# Altium footprint library General_Lib.PcbLib: 729 footprints (part 22 of 46)
Each footprint in its own frame and in the unit in brackets; x right, y up, seen from the top. Pads: shape width x height; smd on the part's side, far side on the other; paste and mask are expansions set on the pad; w line width, h text height; cw(c..) or ccw(c..) is an arc to the next point about the centre after c.
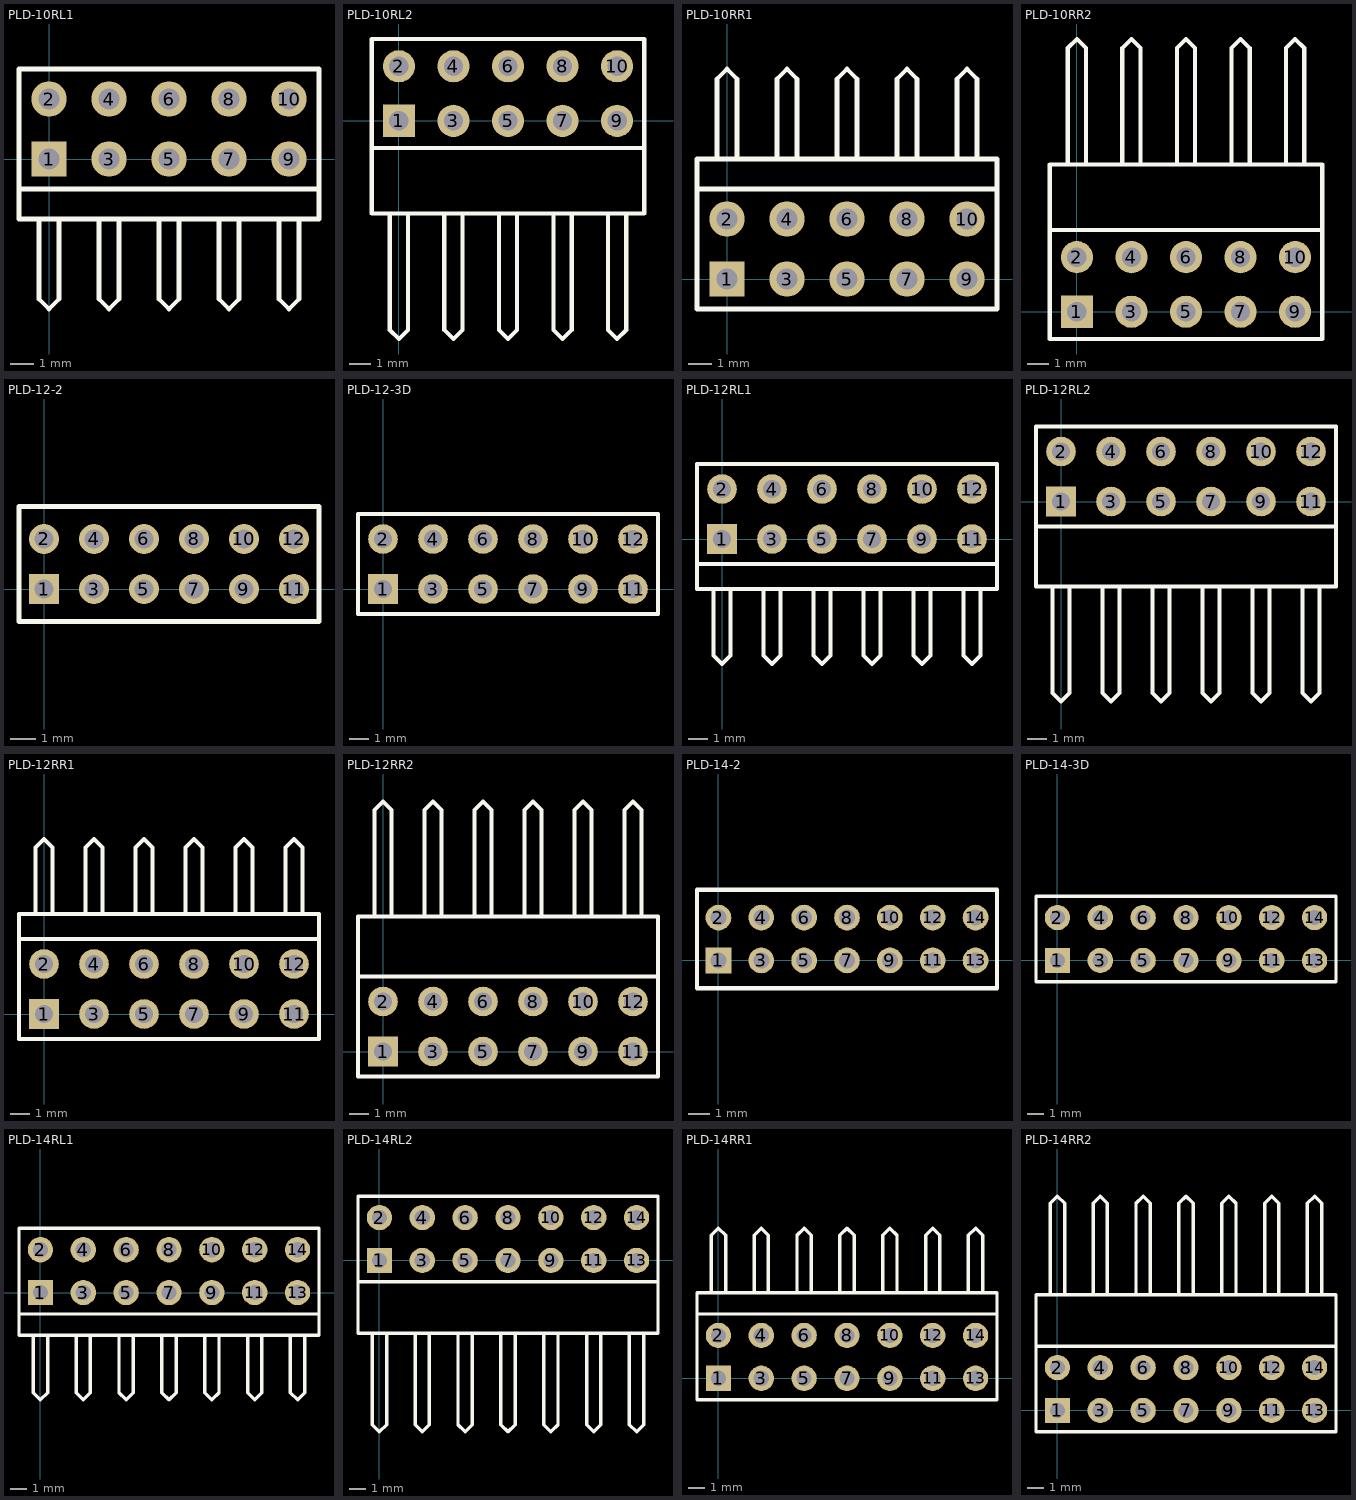
[diagram p21: the footprints below, top view; thin cyan lines are the x and y axes]

## PLD-10RL1 [mm] "Connector; Header; 5x2 Position"
height 7
pads (10):
  rect 1.5x1.5 hole 0.9: 1(0,0)
  round 1.5 hole 0.9: 2(0,2.54) 3(2.54,0) 4(2.54,2.54) 5(5.08,0) 6(5.08,2.54) 7(7.62,0) 8(7.62,2.54) 9(10.16,0) 10(10.16,2.54)
Top Overlay:
  lines w0.2: -0.423,-2.54 -0.423,-5.927 0,-6.35 0.423,-5.927 0.423,-2.54 ; 2.117,-2.54 2.117,-5.927 2.54,-6.35 2.963,-5.927 2.963,-2.54 ; 4.657,-2.54 4.657,-5.927 5.08,-6.35 5.503,-5.927 5.503,-2.54 ; 7.197,-2.54 7.197,-5.927 7.62,-6.35 8.043,-5.927 8.043,-2.54 ; 9.737,-2.54 9.737,-5.927 10.16,-6.35 10.583,-5.927 10.583,-2.54 ; -1.27,-1.27 -1.27,-2.54 11.43,-2.54 11.43,-1.27 ; -1.27,-1.27 11.43,-1.27 ; -1.27,-1.27 -1.27,3.81 11.43,3.81 11.43,-1.27
3D body "PLS-1R.step": height 5.45, standoff -3, extent 3.81,-7.35 6.35,1.27
3D body "PLS-1Rr.stp": height 7.99, standoff -3, extent 3.81,-7.35 6.35,3.81
3D body "PLS-1Rr.stp": height 7.99, standoff -3, extent 1.27,-7.35 3.81,3.81
3D body "PLS-1R.step": height 5.45, standoff -3, extent 1.27,-7.35 3.81,1.27
3D body "PLS-1R.step": height 5.45, standoff -3, extent 8.89,-7.35 11.43,1.27
3D body "PLS-1Rr.stp": height 7.99, standoff -3, extent 8.89,-7.35 11.43,3.81
3D body "PLS-1Rr.stp": height 7.99, standoff -3, extent 6.35,-7.35 8.89,3.81
3D body "PLS-1R.step": height 5.45, standoff -3, extent 6.35,-7.35 8.89,1.27
3D body "PLS-1R.step": height 5.45, standoff -3, extent -1.27,-7.35 1.27,1.27
3D body "PLS-1Rr.stp": height 7.99, standoff -3, extent -1.27,-7.35 1.27,3.81

## PLD-10RL2 [mm] "Connector; Header; 5x2 Position"
height 5
pads (10):
  rect 1.5x1.5 hole 0.9: 1(0,0)
  round 1.5 hole 0.9: 2(0,2.54) 3(2.54,0) 4(2.54,2.54) 5(5.08,0) 6(5.08,2.54) 7(7.62,0) 8(7.62,2.54) 9(10.16,0) 10(10.16,2.54)
Top Overlay:
  lines w0.2: -0.423,-4.318 -0.423,-9.737 0,-10.16 0.423,-9.737 0.423,-4.318 ; 2.117,-4.318 2.117,-9.737 2.54,-10.16 2.963,-9.737 2.963,-4.318 ; 4.657,-4.318 4.657,-9.737 5.08,-10.16 5.503,-9.737 5.503,-4.318 ; 7.197,-4.318 7.197,-9.737 7.62,-10.16 8.043,-9.737 8.043,-4.318 ; 9.737,-4.318 9.737,-9.737 10.16,-10.16 10.583,-9.737 10.583,-4.318 ; 11.43,-1.27 -1.27,-1.27 ; -1.27,-1.27 -1.27,-4.318 11.43,-4.318 11.43,3.81 -1.27,3.81 -1.27,-1.27
3D body "PLD-R2.stp": height 5.08, standoff -2.6, extent -1.27,-9.976 1.27,2.864
3D body "PLD-R2.stp": height 5.08, standoff -2.6, extent 1.27,-9.976 3.81,2.864
3D body "PLD-R2.stp": height 5.08, standoff -2.6, extent 3.81,-9.976 6.35,2.864
3D body "PLD-R2.stp": height 5.08, standoff -2.6, extent 6.35,-9.976 8.89,2.864
3D body "PLD-R2.stp": height 5.08, standoff -2.6, extent 8.89,-9.976 11.43,2.864

## PLD-10RR1 [mm] "Connector; Header; 5x2 Position"
height 7
pads (10):
  rect 1.5x1.5 hole 0.9: 1(0,0)
  round 1.5 hole 0.9: 2(0,2.54) 3(2.54,0) 4(2.54,2.54) 5(5.08,0) 6(5.08,2.54) 7(7.62,0) 8(7.62,2.54) 9(10.16,0) 10(10.16,2.54)
Top Overlay:
  lines w0.2: -0.423,5.08 -0.423,8.467 0,8.89 0.423,8.467 0.423,5.08 ; 2.117,5.08 2.117,8.467 2.54,8.89 2.963,8.467 2.963,5.08 ; 4.657,5.08 4.657,8.467 5.08,8.89 5.503,8.467 5.503,5.08 ; 7.197,5.08 7.197,8.467 7.62,8.89 8.043,8.467 8.043,5.08 ; 9.737,5.08 9.737,8.467 10.16,8.89 10.583,8.467 10.583,5.08 ; -1.27,3.81 -1.27,5.08 11.43,5.08 11.43,3.81 ; -1.27,3.81 11.43,3.81 ; -1.27,3.81 -1.27,-1.27 11.43,-1.27 11.43,3.81
3D body "PLS-1R.step": height 5.45, standoff -3, extent 3.81,1.27 6.35,9.89
3D body "PLS-1Rr.stp": height 7.99, standoff -3, extent 3.81,-1.27 6.35,9.89
3D body "PLS-1Rr.stp": height 7.99, standoff -3, extent 6.35,-1.27 8.89,9.89
3D body "PLS-1R.step": height 5.45, standoff -3, extent 6.35,1.27 8.89,9.89
3D body "PLS-1R.step": height 5.45, standoff -3, extent -1.27,1.27 1.27,9.89
3D body "PLS-1Rr.stp": height 7.99, standoff -3, extent -1.27,-1.27 1.27,9.89
3D body "PLS-1Rr.stp": height 7.99, standoff -3, extent 1.27,-1.27 3.81,9.89
3D body "PLS-1R.step": height 5.45, standoff -3, extent 1.27,1.27 3.81,9.89
3D body "PLS-1R.step": height 5.45, standoff -3, extent 8.89,1.27 11.43,9.89
3D body "PLS-1Rr.stp": height 7.99, standoff -3, extent 8.89,-1.27 11.43,9.89

## PLD-10RR2 [mm] "Connector; Header; 5x2 Position"
height 5
pads (10):
  rect 1.5x1.5 hole 0.9: 1(0,0)
  round 1.5 hole 0.9: 2(0,2.54) 3(2.54,0) 4(2.54,2.54) 5(5.08,0) 6(5.08,2.54) 7(7.62,0) 8(7.62,2.54) 9(10.16,0) 10(10.16,2.54)
Top Overlay:
  lines w0.2: -0.423,6.858 -0.423,12.277 0,12.7 0.423,12.277 0.423,6.858 ; 2.117,6.858 2.117,12.277 2.54,12.7 2.963,12.277 2.963,6.858 ; 4.657,6.858 4.657,12.277 5.08,12.7 5.503,12.277 5.503,6.858 ; 7.197,6.858 7.197,12.277 7.62,12.7 8.043,12.277 8.043,6.858 ; 9.737,6.858 9.737,12.277 10.16,12.7 10.583,12.277 10.583,6.858 ; 11.43,3.81 -1.27,3.81 ; -1.27,3.81 -1.27,-1.27 11.43,-1.27 11.43,6.858 -1.27,6.858 -1.27,3.81
3D body "PLD-R2.stp": height 5.08, standoff -2.6, extent 8.89,-0.324 11.43,12.516
3D body "PLD-R2.stp": height 5.08, standoff -2.6, extent 6.35,-0.324 8.89,12.516
3D body "PLD-R2.stp": height 5.08, standoff -2.6, extent 3.81,-0.324 6.35,12.516
3D body "PLD-R2.stp": height 5.08, standoff -2.6, extent 1.27,-0.324 3.81,12.516
3D body "PLD-R2.stp": height 5.08, standoff -2.6, extent -1.27,-0.324 1.27,12.516

## PLD-12-2 [mm] "Connector; Header; 6x2 Position"
height 6
pads (12):
  rect 1.2x1.2 hole 0.75: 1(0,0)
  round 1.2 hole 0.75: 2(0,2) 3(2,0) 4(2,2) 5(4,0) 6(4,2) 7(6,0) 8(6,2) 9(8,0) 10(8,2) 11(10,0) 12(10,2)
Top Overlay:
  lines w0.2: -1,-1.3 11,-1.3 11,3.3 -1,3.3 -1,-1.3
3D body "pld-2mm.stp": height 5.5, standoff -2.5, extent -1,-1.3 1,3.3
3D body "pld-2mm.stp": height 5.5, standoff -2.5, extent 1,-1.3 3,3.3
3D body "pld-2mm.stp": height 5.5, standoff -2.5, extent 3,-1.3 5,3.3
3D body "pld-2mm.stp": height 5.5, standoff -2.5, extent 5,-1.3 7,3.3
3D body "pld-2mm.stp": height 5.5, standoff -2.5, extent 7,-1.3 9,3.3
3D body "pld-2mm.stp": height 5.5, standoff -2.5, extent 9,-1.3 11,3.3

## PLD-12-3D [mm] "Connector; Header; 6x2 Position"
height 7.5
pads (12):
  rect 1.5x1.5 hole 0.9: 1(0,0)
  round 1.5 hole 0.9: 2(0,2.54) 3(2.54,0) 4(2.54,2.54) 5(5.08,0) 6(5.08,2.54) 7(7.62,0) 8(7.62,2.54) 9(10.16,0) 10(10.16,2.54) 11(12.7,0) 12(12.7,2.54)
Top Overlay:
  lines w0.2: -1.27,-1.27 13.97,-1.27 13.97,3.81 -1.27,3.81 -1.27,-1.27
3D body "PLD-12.step": height 8.4, standoff -3, extent -1.27,-1.23 13.97,3.77

## PLD-12RL1 [mm] "Connector; Header; 6x2 Position"
height 7
pads (12):
  rect 1.5x1.5 hole 0.9: 1(0,0)
  round 1.5 hole 0.9: 2(0,2.54) 3(2.54,0) 4(2.54,2.54) 5(5.08,0) 6(5.08,2.54) 7(7.62,0) 8(7.62,2.54) 9(10.16,0) 10(10.16,2.54) 11(12.7,0) 12(12.7,2.54)
Top Overlay:
  lines w0.2: -0.423,-2.54 -0.423,-5.927 0,-6.35 0.423,-5.927 0.423,-2.54 ; 2.117,-2.54 2.117,-5.927 2.54,-6.35 2.963,-5.927 2.963,-2.54 ; 4.657,-2.54 4.657,-5.927 5.08,-6.35 5.503,-5.927 5.503,-2.54 ; 7.197,-2.54 7.197,-5.927 7.62,-6.35 8.043,-5.927 8.043,-2.54 ; 9.737,-2.54 9.737,-5.927 10.16,-6.35 10.583,-5.927 10.583,-2.54 ; 12.277,-2.54 12.277,-5.927 12.7,-6.35 13.123,-5.927 13.123,-2.54 ; -1.27,-1.27 -1.27,-2.54 13.97,-2.54 13.97,-1.27 ; -1.27,-1.27 13.97,-1.27 ; -1.27,-1.27 -1.27,3.81 13.97,3.81 13.97,-1.27
3D body "PLS-1R.step": height 5.45, standoff -3, extent 8.89,-7.35 11.43,1.27
3D body "PLS-1Rr.stp": height 7.99, standoff -3, extent 8.89,-7.35 11.43,3.81
3D body "PLS-1Rr.stp": height 7.99, standoff -3, extent 11.43,-7.35 13.97,3.81
3D body "PLS-1R.step": height 5.45, standoff -3, extent 11.43,-7.35 13.97,1.27
3D body "PLS-1R.step": height 5.45, standoff -3, extent 3.81,-7.35 6.35,1.27
3D body "PLS-1Rr.stp": height 7.99, standoff -3, extent 3.81,-7.35 6.35,3.81
3D body "PLS-1Rr.stp": height 7.99, standoff -3, extent 6.35,-7.35 8.89,3.81
3D body "PLS-1R.step": height 5.45, standoff -3, extent 6.35,-7.35 8.89,1.27
3D body "PLS-1R.step": height 5.45, standoff -3, extent -1.27,-7.35 1.27,1.27
3D body "PLS-1Rr.stp": height 7.99, standoff -3, extent -1.27,-7.35 1.27,3.81
3D body "PLS-1Rr.stp": height 7.99, standoff -3, extent 1.27,-7.35 3.81,3.81
3D body "PLS-1R.step": height 5.45, standoff -3, extent 1.27,-7.35 3.81,1.27

## PLD-12RL2 [mm] "Connector; Header; 6x2 Position"
height 5
pads (12):
  rect 1.5x1.5 hole 0.9: 1(0,0)
  round 1.5 hole 0.9: 2(0,2.54) 3(2.54,0) 4(2.54,2.54) 5(5.08,0) 6(5.08,2.54) 7(7.62,0) 8(7.62,2.54) 9(10.16,0) 10(10.16,2.54) 11(12.7,0) 12(12.7,2.54)
Top Overlay:
  lines w0.2: -0.423,-4.318 -0.423,-9.737 0,-10.16 0.423,-9.737 0.423,-4.318 ; 2.117,-4.318 2.117,-9.737 2.54,-10.16 2.963,-9.737 2.963,-4.318 ; 4.657,-4.318 4.657,-9.737 5.08,-10.16 5.503,-9.737 5.503,-4.318 ; 7.197,-4.318 7.197,-9.737 7.62,-10.16 8.043,-9.737 8.043,-4.318 ; 9.737,-4.318 9.737,-9.737 10.16,-10.16 10.583,-9.737 10.583,-4.318 ; 12.277,-4.318 12.277,-9.737 12.7,-10.16 13.123,-9.737 13.123,-4.318 ; 13.97,-1.27 -1.27,-1.27 ; -1.27,-1.27 -1.27,3.81 13.97,3.81 13.97,-4.318 -1.27,-4.318 -1.27,-1.27
3D body "PLD-R2.stp": height 5.08, standoff -2.6, extent 3.81,-9.976 6.35,2.864
3D body "PLD-R2.stp": height 5.08, standoff -2.6, extent 1.27,-9.976 3.81,2.864
3D body "PLD-R2.stp": height 5.08, standoff -2.6, extent -1.27,-9.976 1.27,2.864
3D body "PLD-R2.stp": height 5.08, standoff -2.6, extent 11.43,-9.976 13.97,2.864
3D body "PLD-R2.stp": height 5.08, standoff -2.6, extent 8.89,-9.976 11.43,2.864
3D body "PLD-R2.stp": height 5.08, standoff -2.6, extent 6.35,-9.976 8.89,2.864

## PLD-12RR1 [mm] "Connector; Header; 6x2 Position"
height 7
pads (12):
  rect 1.5x1.5 hole 0.9: 1(0,0)
  round 1.5 hole 0.9: 2(0,2.54) 3(2.54,0) 4(2.54,2.54) 5(5.08,0) 6(5.08,2.54) 7(7.62,0) 8(7.62,2.54) 9(10.16,0) 10(10.16,2.54) 11(12.7,0) 12(12.7,2.54)
Top Overlay:
  lines w0.2: -0.423,5.08 -0.423,8.467 0,8.89 0.423,8.467 0.423,5.08 ; 2.117,5.08 2.117,8.467 2.54,8.89 2.963,8.467 2.963,5.08 ; 4.657,5.08 4.657,8.467 5.08,8.89 5.503,8.467 5.503,5.08 ; 7.197,5.08 7.197,8.467 7.62,8.89 8.043,8.467 8.043,5.08 ; 9.737,5.08 9.737,8.467 10.16,8.89 10.583,8.467 10.583,5.08 ; 12.277,5.08 12.277,8.467 12.7,8.89 13.123,8.467 13.123,5.08 ; -1.27,3.81 -1.27,5.08 13.97,5.08 13.97,3.81 ; -1.27,3.81 13.97,3.81 ; -1.27,3.81 -1.27,-1.27 13.97,-1.27 13.97,3.81
3D body "PLS-1R.step": height 5.45, standoff -3, extent 8.89,1.27 11.43,9.89
3D body "PLS-1Rr.stp": height 7.99, standoff -3, extent 8.89,-1.27 11.43,9.89
3D body "PLS-1Rr.stp": height 7.99, standoff -3, extent 11.43,-1.27 13.97,9.89
3D body "PLS-1R.step": height 5.45, standoff -3, extent 11.43,1.27 13.97,9.89
3D body "PLS-1R.step": height 5.45, standoff -3, extent 3.81,1.27 6.35,9.89
3D body "PLS-1Rr.stp": height 7.99, standoff -3, extent 3.81,-1.27 6.35,9.89
3D body "PLS-1Rr.stp": height 7.99, standoff -3, extent 6.35,-1.27 8.89,9.89
3D body "PLS-1R.step": height 5.45, standoff -3, extent 6.35,1.27 8.89,9.89
3D body "PLS-1R.step": height 5.45, standoff -3, extent -1.27,1.27 1.27,9.89
3D body "PLS-1Rr.stp": height 7.99, standoff -3, extent -1.27,-1.27 1.27,9.89
3D body "PLS-1Rr.stp": height 7.99, standoff -3, extent 1.27,-1.27 3.81,9.89
3D body "PLS-1R.step": height 5.45, standoff -3, extent 1.27,1.27 3.81,9.89

## PLD-12RR2 [mm] "Connector; Header; 6x2 Position"
height 5
pads (12):
  rect 1.5x1.5 hole 0.9: 1(0,0)
  round 1.5 hole 0.9: 2(0,2.54) 3(2.54,0) 4(2.54,2.54) 5(5.08,0) 6(5.08,2.54) 7(7.62,0) 8(7.62,2.54) 9(10.16,0) 10(10.16,2.54) 11(12.7,0) 12(12.7,2.54)
Top Overlay:
  lines w0.2: -0.423,6.858 -0.423,12.277 0,12.7 0.423,12.277 0.423,6.858 ; 2.117,6.858 2.117,12.277 2.54,12.7 2.963,12.277 2.963,6.858 ; 4.657,6.858 4.657,12.277 5.08,12.7 5.503,12.277 5.503,6.858 ; 7.197,6.858 7.197,12.277 7.62,12.7 8.043,12.277 8.043,6.858 ; 9.737,6.858 9.737,12.277 10.16,12.7 10.583,12.277 10.583,6.858 ; 12.277,6.858 12.277,12.277 12.7,12.7 13.123,12.277 13.123,6.858 ; 13.97,3.81 -1.27,3.81 ; -1.27,3.81 -1.27,-1.27 13.97,-1.27 13.97,6.858 -1.27,6.858 -1.27,3.81
3D body "PLD-R2.stp": height 5.08, standoff -2.6, extent 3.81,-0.324 6.35,12.516
3D body "PLD-R2.stp": height 5.08, standoff -2.6, extent 1.27,-0.324 3.81,12.516
3D body "PLD-R2.stp": height 5.08, standoff -2.6, extent -1.27,-0.324 1.27,12.516
3D body "PLD-R2.stp": height 5.08, standoff -2.6, extent 11.43,-0.324 13.97,12.516
3D body "PLD-R2.stp": height 5.08, standoff -2.6, extent 8.89,-0.324 11.43,12.516
3D body "PLD-R2.stp": height 5.08, standoff -2.6, extent 6.35,-0.324 8.89,12.516

## PLD-14-2 [mm] "Connector; Header; 7x2 Position"
height 6
pads (14):
  rect 1.2x1.2 hole 0.75: 1(0,0)
  round 1.2 hole 0.75: 2(0,2) 3(2,0) 4(2,2) 5(4,0) 6(4,2) 7(6,0) 8(6,2) 9(8,0) 10(8,2) 11(10,0) 12(10,2) 13(12,0) 14(12,2)
Top Overlay:
  lines w0.2: -1,-1.3 -1,3.3 13,3.3 13,-1.3 -1,-1.3
3D body "pld-2mm.stp": height 5.5, standoff -2.5, extent 11,-1.3 13,3.3
3D body "pld-2mm.stp": height 5.5, standoff -2.5, extent 9,-1.3 11,3.3
3D body "pld-2mm.stp": height 5.5, standoff -2.5, extent 7,-1.3 9,3.3
3D body "pld-2mm.stp": height 5.5, standoff -2.5, extent 5,-1.3 7,3.3
3D body "pld-2mm.stp": height 5.5, standoff -2.5, extent 3,-1.3 5,3.3
3D body "pld-2mm.stp": height 5.5, standoff -2.5, extent 1,-1.3 3,3.3
3D body "pld-2mm.stp": height 5.5, standoff -2.5, extent -1,-1.3 1,3.3

## PLD-14-3D [mm] "Connector; Header; 7x2 Position"
height 7.5
pads (14):
  rect 1.5x1.5 hole 0.9: 1(0,0)
  round 1.5 hole 0.9: 2(0,2.54) 3(2.54,0) 4(2.54,2.54) 5(5.08,0) 6(5.08,2.54) 7(7.62,0) 8(7.62,2.54) 9(10.16,0) 10(10.16,2.54) 11(12.7,0) 12(12.7,2.54) 13(15.24,0) 14(15.24,2.54)
Top Overlay:
  lines w0.2: -1.27,-1.27 -1.27,3.81 16.51,3.81 16.51,-1.27 -1.27,-1.27
3D body "PLD-14.step": height 8.4, standoff -3, extent -1.27,-1.23 16.51,3.77

## PLD-14RL1 [mm] "Connector; Header; 7x2 Position"
height 7
pads (14):
  rect 1.5x1.5 hole 0.9: 1(0,0)
  round 1.5 hole 0.9: 2(0,2.54) 3(2.54,0) 4(2.54,2.54) 5(5.08,0) 6(5.08,2.54) 7(7.62,0) 8(7.62,2.54) 9(10.16,0) 10(10.16,2.54) 11(12.7,0) 12(12.7,2.54) 13(15.24,0) 14(15.24,2.54)
Top Overlay:
  lines w0.2: -0.423,-2.54 -0.423,-5.927 0,-6.35 0.423,-5.927 0.423,-2.54 ; 2.117,-2.54 2.117,-5.927 2.54,-6.35 2.963,-5.927 2.963,-2.54 ; 4.657,-2.54 4.657,-5.927 5.08,-6.35 5.503,-5.927 5.503,-2.54 ; 7.197,-2.54 7.197,-5.927 7.62,-6.35 8.043,-5.927 8.043,-2.54 ; 9.737,-2.54 9.737,-5.927 10.16,-6.35 10.583,-5.927 10.583,-2.54 ; 12.277,-2.54 12.277,-5.927 12.7,-6.35 13.123,-5.927 13.123,-2.54 ; 14.817,-2.54 14.817,-5.927 15.24,-6.35 15.663,-5.927 15.663,-2.54 ; -1.27,-1.27 -1.27,-2.54 16.51,-2.54 16.51,-1.27 ; -1.27,-1.27 -1.27,3.81 16.51,3.81 16.51,-1.27 ; -1.27,-1.27 16.51,-1.27
3D body "PLS-1Rr.stp": height 7.99, standoff -3, extent 13.97,-7.35 16.51,3.81
3D body "PLS-1R.step": height 5.45, standoff -3, extent 13.97,-7.35 16.51,1.27
3D body "PLS-1R.step": height 5.45, standoff -3, extent -1.27,-7.35 1.27,1.27
3D body "PLS-1Rr.stp": height 7.99, standoff -3, extent -1.27,-7.35 1.27,3.81
3D body "PLS-1Rr.stp": height 7.99, standoff -3, extent 1.27,-7.35 3.81,3.81
3D body "PLS-1R.step": height 5.45, standoff -3, extent 1.27,-7.35 3.81,1.27
3D body "PLS-1R.step": height 5.45, standoff -3, extent 3.81,-7.35 6.35,1.27
3D body "PLS-1Rr.stp": height 7.99, standoff -3, extent 3.81,-7.35 6.35,3.81
3D body "PLS-1Rr.stp": height 7.99, standoff -3, extent 6.35,-7.35 8.89,3.81
3D body "PLS-1R.step": height 5.45, standoff -3, extent 6.35,-7.35 8.89,1.27
3D body "PLS-1R.step": height 5.45, standoff -3, extent 8.89,-7.35 11.43,1.27
3D body "PLS-1Rr.stp": height 7.99, standoff -3, extent 8.89,-7.35 11.43,3.81
3D body "PLS-1Rr.stp": height 7.99, standoff -3, extent 11.43,-7.35 13.97,3.81
3D body "PLS-1R.step": height 5.45, standoff -3, extent 11.43,-7.35 13.97,1.27

## PLD-14RL2 [mm] "Connector; Header; 7x2 Position"
height 5
pads (14):
  rect 1.5x1.5 hole 0.9: 1(0,0)
  round 1.5 hole 0.9: 2(0,2.54) 3(2.54,0) 4(2.54,2.54) 5(5.08,0) 6(5.08,2.54) 7(7.62,0) 8(7.62,2.54) 9(10.16,0) 10(10.16,2.54) 11(12.7,0) 12(12.7,2.54) 13(15.24,0) 14(15.24,2.54)
Top Overlay:
  lines w0.2: -0.423,-4.318 -0.423,-9.737 0,-10.16 0.423,-9.737 0.423,-4.318 ; 2.117,-4.318 2.117,-9.737 2.54,-10.16 2.963,-9.737 2.963,-4.318 ; 4.657,-4.318 4.657,-9.737 5.08,-10.16 5.503,-9.737 5.503,-4.318 ; 7.197,-4.318 7.197,-9.737 7.62,-10.16 8.043,-9.737 8.043,-4.318 ; 9.737,-4.318 9.737,-9.737 10.16,-10.16 10.583,-9.737 10.583,-4.318 ; 12.277,-4.318 12.277,-9.737 12.7,-10.16 13.123,-9.737 13.123,-4.318 ; 14.817,-4.318 14.817,-9.737 15.24,-10.16 15.663,-9.737 15.663,-4.318 ; 16.51,-1.27 -1.27,-1.27 ; -1.27,-1.27 -1.27,-4.318 16.51,-4.318 16.51,3.81 -1.27,3.81 -1.27,-1.27
3D body "PLD-R2.stp": height 5.08, standoff -2.6, extent 13.97,-9.976 16.51,2.864
3D body "PLD-R2.stp": height 5.08, standoff -2.6, extent 3.81,-9.976 6.35,2.864
3D body "PLD-R2.stp": height 5.08, standoff -2.6, extent 1.27,-9.976 3.81,2.864
3D body "PLD-R2.stp": height 5.08, standoff -2.6, extent -1.27,-9.976 1.27,2.864
3D body "PLD-R2.stp": height 5.08, standoff -2.6, extent 11.43,-9.976 13.97,2.864
3D body "PLD-R2.stp": height 5.08, standoff -2.6, extent 8.89,-9.976 11.43,2.864
3D body "PLD-R2.stp": height 5.08, standoff -2.6, extent 6.35,-9.976 8.89,2.864

## PLD-14RR1 [mm] "Connector; Header; 7x2 Position"
height 7
pads (14):
  rect 1.5x1.5 hole 0.9: 1(0,0)
  round 1.5 hole 0.9: 2(0,2.54) 3(2.54,0) 4(2.54,2.54) 5(5.08,0) 6(5.08,2.54) 7(7.62,0) 8(7.62,2.54) 9(10.16,0) 10(10.16,2.54) 11(12.7,0) 12(12.7,2.54) 13(15.24,0) 14(15.24,2.54)
Top Overlay:
  lines w0.2: -0.423,5.08 -0.423,8.467 0,8.89 0.423,8.467 0.423,5.08 ; 2.117,5.08 2.117,8.467 2.54,8.89 2.963,8.467 2.963,5.08 ; 4.657,5.08 4.657,8.467 5.08,8.89 5.503,8.467 5.503,5.08 ; 7.197,5.08 7.197,8.467 7.62,8.89 8.043,8.467 8.043,5.08 ; 9.737,5.08 9.737,8.467 10.16,8.89 10.583,8.467 10.583,5.08 ; 12.277,5.08 12.277,8.467 12.7,8.89 13.123,8.467 13.123,5.08 ; 14.817,5.08 14.817,8.467 15.24,8.89 15.663,8.467 15.663,5.08 ; -1.27,3.81 -1.27,5.08 16.51,5.08 16.51,3.81 ; -1.27,3.81 -1.27,-1.27 16.51,-1.27 16.51,3.81 ; -1.27,3.81 16.51,3.81
3D body "PLS-1Rr.stp": height 7.99, standoff -3, extent 13.97,-1.27 16.51,9.89
3D body "PLS-1R.step": height 5.45, standoff -3, extent 13.97,1.27 16.51,9.89
3D body "PLS-1R.step": height 5.45, standoff -3, extent 1.27,1.27 3.81,9.89
3D body "PLS-1Rr.stp": height 7.99, standoff -3, extent 1.27,-1.27 3.81,9.89
3D body "PLS-1Rr.stp": height 7.99, standoff -3, extent -1.27,-1.27 1.27,9.89
3D body "PLS-1R.step": height 5.45, standoff -3, extent -1.27,1.27 1.27,9.89
3D body "PLS-1R.step": height 5.45, standoff -3, extent 6.35,1.27 8.89,9.89
3D body "PLS-1Rr.stp": height 7.99, standoff -3, extent 6.35,-1.27 8.89,9.89
3D body "PLS-1Rr.stp": height 7.99, standoff -3, extent 3.81,-1.27 6.35,9.89
3D body "PLS-1R.step": height 5.45, standoff -3, extent 3.81,1.27 6.35,9.89
3D body "PLS-1R.step": height 5.45, standoff -3, extent 11.43,1.27 13.97,9.89
3D body "PLS-1Rr.stp": height 7.99, standoff -3, extent 11.43,-1.27 13.97,9.89
3D body "PLS-1Rr.stp": height 7.99, standoff -3, extent 8.89,-1.27 11.43,9.89
3D body "PLS-1R.step": height 5.45, standoff -3, extent 8.89,1.27 11.43,9.89

## PLD-14RR2 [mm] "Connector; Header; 7x2 Position"
height 5
pads (14):
  rect 1.5x1.5 hole 0.9: 1(0,0)
  round 1.5 hole 0.9: 2(0,2.54) 3(2.54,0) 4(2.54,2.54) 5(5.08,0) 6(5.08,2.54) 7(7.62,0) 8(7.62,2.54) 9(10.16,0) 10(10.16,2.54) 11(12.7,0) 12(12.7,2.54) 13(15.24,0) 14(15.24,2.54)
Top Overlay:
  lines w0.2: -0.423,6.858 -0.423,12.277 0,12.7 0.423,12.277 0.423,6.858 ; 2.117,6.858 2.117,12.277 2.54,12.7 2.963,12.277 2.963,6.858 ; 4.657,6.858 4.657,12.277 5.08,12.7 5.503,12.277 5.503,6.858 ; 7.197,6.858 7.197,12.277 7.62,12.7 8.043,12.277 8.043,6.858 ; 9.737,6.858 9.737,12.277 10.16,12.7 10.583,12.277 10.583,6.858 ; 12.277,6.858 12.277,12.277 12.7,12.7 13.123,12.277 13.123,6.858 ; 14.817,6.858 14.817,12.277 15.24,12.7 15.663,12.277 15.663,6.858 ; 16.51,3.81 -1.27,3.81 ; -1.27,3.81 -1.27,6.858 16.51,6.858 16.51,-1.27 -1.27,-1.27 -1.27,3.81
3D body "PLD-R2.stp": height 5.08, standoff -2.6, extent 13.97,-0.324 16.51,12.516
3D body "PLD-R2.stp": height 5.08, standoff -2.6, extent 3.81,-0.324 6.35,12.516
3D body "PLD-R2.stp": height 5.08, standoff -2.6, extent 1.27,-0.324 3.81,12.516
3D body "PLD-R2.stp": height 5.08, standoff -2.6, extent -1.27,-0.324 1.27,12.516
3D body "PLD-R2.stp": height 5.08, standoff -2.6, extent 11.43,-0.324 13.97,12.516
3D body "PLD-R2.stp": height 5.08, standoff -2.6, extent 8.89,-0.324 11.43,12.516
3D body "PLD-R2.stp": height 5.08, standoff -2.6, extent 6.35,-0.324 8.89,12.516